# Altium footprint library iuh-thuc-hanh.PcbLib: 63 footprints (part 1 of 4)
Each footprint in its own frame and in the unit in brackets; x right, y up, seen from the top. Pads: shape width x height; smd on the part's side, far side on the other; paste and mask are expansions set on the pad; w line width, h text height; cw(c..) or ccw(c..) is an arc to the next point about the centre after c.
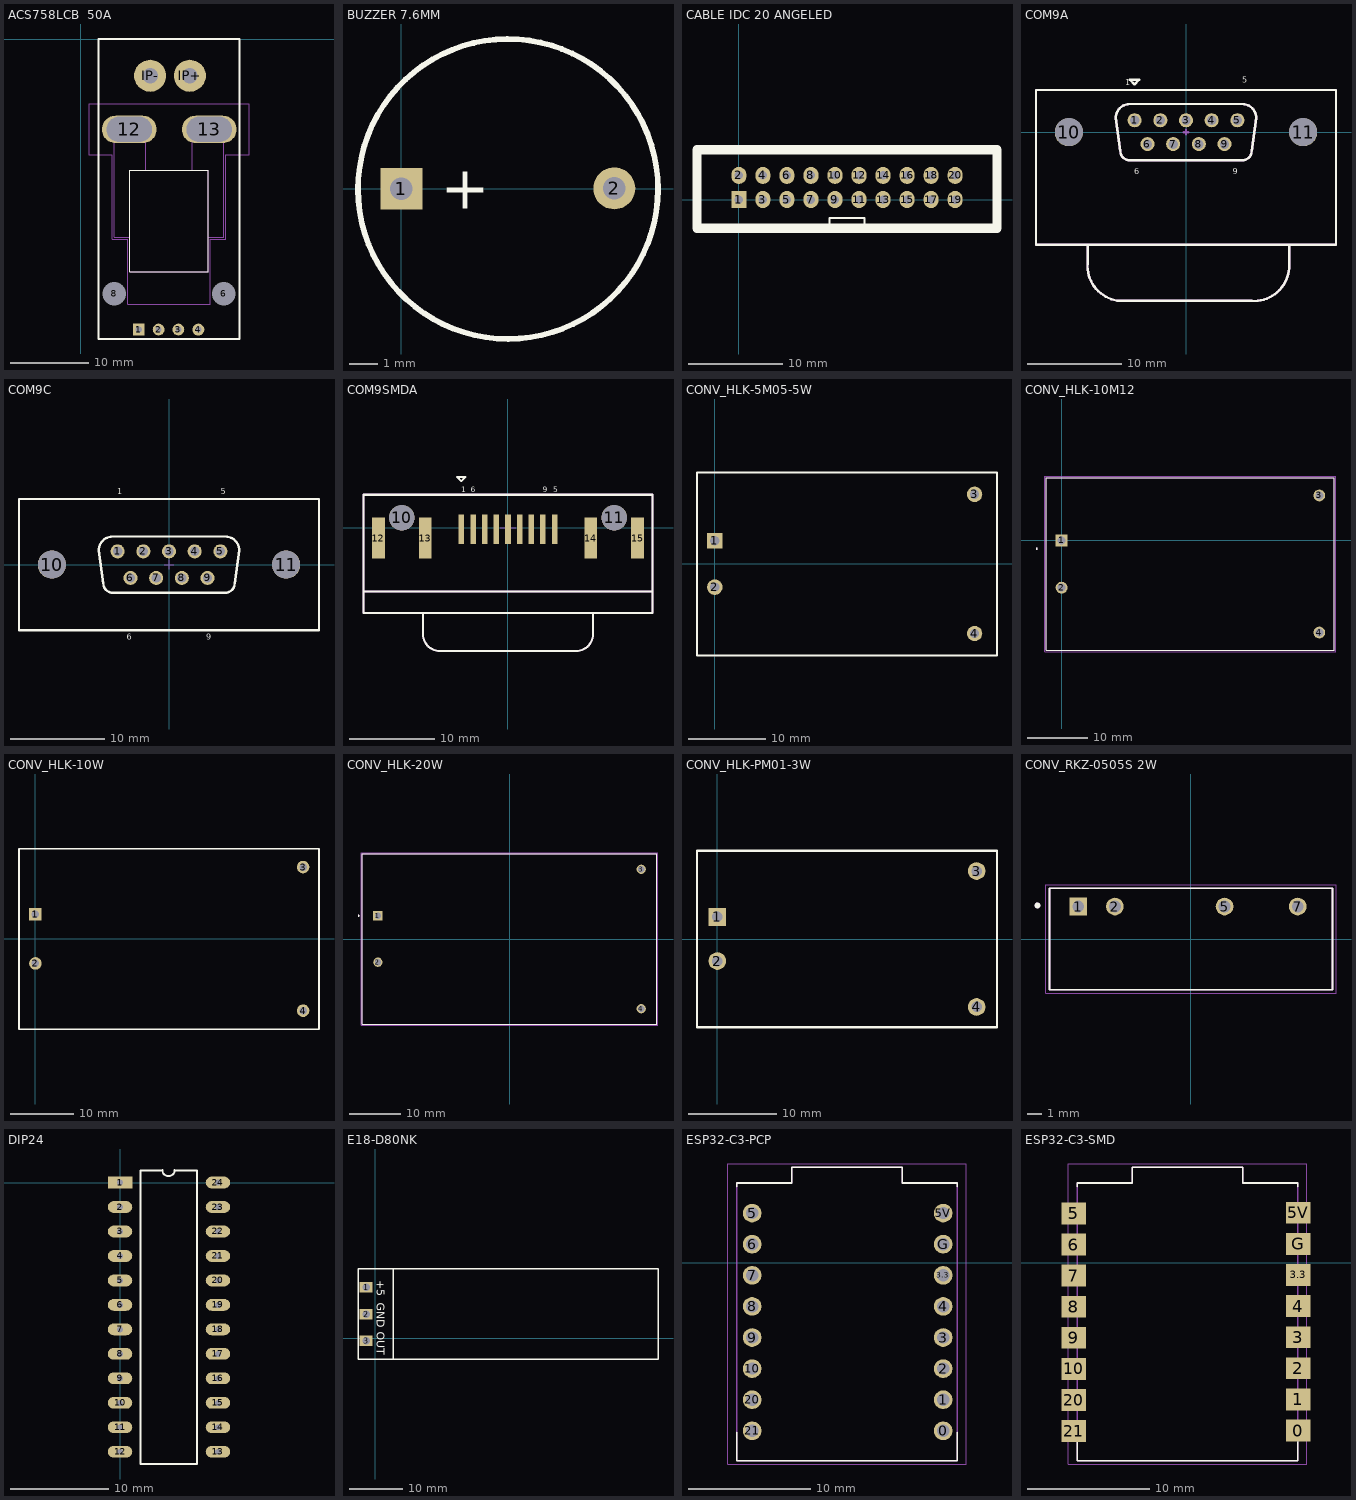
[diagram p0: the footprints below, top view; thin cyan lines are the x and y axes]

## ACS758LCB  50A [mm]
height 7.1
pads (10):
  rect 1.5x1.5 / inner round 1.5 / far side rect 1.5x1.5 hole 0.8: 1(7.434,-37.148)
  round 1.5 hole 0.8: 2(9.974,-37.148) 3(12.506,-37.148)
  round 1.524 hole 0.762: 4(15.054,-37.148)
  round 1.524 hole 3: 6(18.288,-32.575) 8(4.318,-32.575)
  oval 7x3.5 hole 3.2 slot 5.8 at 0 deg unplated: 12(6.223,-11.557) 13(16.447,-11.557)
  round 4.1 hole 2: IP+(13.97,-4.699) IP-(8.89,-4.699)
Top Overlay:
  circle w0.2: c10.219,-36.965 r0.1
  lines w0.127: 6.303,-29.775 16.303,-29.775 16.303,-16.775 6.303,-16.775 6.303,-29.775
  lines w0.254: 2.286,-38.354 2.286,0 20.32,0 20.32,-13.525 20.32,-38.354 2.286,-38.354
Mechanical 1:
  lines w0: 6.303,-10.525 6.353,-10.525 ; 16.303,-10.525 16.353,-10.525 ; 4.303,-12.525 cw(c4.303,-11.525) 4.303,-10.525 8.303,-10.525 cw(c8.303,-11.525) 8.303,-12.525 4.303,-12.525 ; 14.303,-12.525 cw(c14.303,-11.525) 14.303,-10.525 18.303,-10.525 cw(c18.303,-11.525) 18.303,-12.525 14.303,-12.525
Mechanical 13:
  circle w0.2: c10.219,-36.965 r0.1
  lines w0.127: 4.303,-10.775 4.303,-25.375 6.303,-25.375 ; 8.303,-16.725 8.303,-10.775 ; 14.303,-16.725 14.303,-10.775 18.303,-10.775 18.303,-25.375 16.303,-25.375 ; 6.303,-25.375 6.303,-16.775 16.303,-16.775 16.303,-29.775 6.303,-29.775 6.303,-25.375
Mechanical 15:
  lines w0.05: 1.053,-14.775 4.053,-14.775 4.053,-25.625 6.053,-25.625 6.053,-33.925 16.553,-33.925 16.553,-25.625 18.553,-25.625 18.553,-14.775 21.553,-14.775 21.553,-8.275 1.053,-8.275 ; 1.079,-14.755 1.079,-8.255
3D body "step_temp.STEP": height 7.1, standoff -3.5, extent 4.366,-33.361 18.367,-10.775
3D body: height -0.1, standoff -0.2, extent 2.27,-34.037 20.32,-8.234

## BUZZER 7.6MM [mm]
pads (2):
  rect 1.5x1.5 hole 0.8: 1(0,0)
  round 1.5 hole 0.8: 2(7.62,0.013)
Top Overlay:
  lines w0.203: 7.724,3.67 ccw(c3.816,-0.008) 7.76,3.632
  text "+" at 1.41,-0.711 h1.52
3D body "User Library-Buzzer WST-1203UX.step": height 4.5, standoff -9.65, extent -2.215,-6 13.239,6

## CABLE IDC 20 ANGELED [mm] "Connector; Header; 5x2 Position"
pads (20):
  rect 1.6x1.8 hole 0.9: 1(0,0)
  oval 1.6x1.8 hole 0.9: 2(0,2.54) 3(2.54,0) 4(2.54,2.54) 5(5.08,0) 6(5.08,2.54) 7(7.62,0) 8(7.62,2.54) 9(10.16,0) 10(10.16,2.54) 11(12.7,0) 12(12.7,2.54) 13(15.24,0) 14(15.24,2.54) 15(17.78,0) 16(17.78,2.54) 17(20.32,0) 18(20.32,2.54) 19(22.86,0) 20(22.86,2.54)
Top Overlay:
  lines w0.254: 9.576,-2.5 9.576,-1.956 11.43,-1.956 13.284,-1.956 13.284,-2.5
  lines w1: 8.28,-3.048 27.28,-3.048 27.28,5.27 8.28,5.27 ; 14.58,-3.048 -4.42,-3.048 -4.42,5.27 14.58,5.27
3D body "IDC 20P ANGELED MALE.stp": height 10.61, standoff -2.39, extent -5.08,-0.292 27.94,20.853

## COM9A [mm] "D-SUB- 9P, MALE, RT ANGLE, TH"
height 12
pads (11):
  round 1.5 hole 1 unplated: 1(-5.48,1.27) 2(-2.74,1.27) 3(0,1.27) 4(2.74,1.27) 5(5.48,1.27) 6(-4.11,-1.27) 7(-1.37,-1.27) 8(1.37,-1.27) 9(4.11,-1.27)
  round 3 hole 3 unplated: 10(-12.5,0) 11(12.5,0)
Top Overlay:
  lines w0.254: -10.5,-12 -10.5,-14 ccw(c-6.75,-14.25) -7,-18 7,-18 ccw(c7.25,-14.25) 11,-14.5 11,-12 ; -5.996,-3.004 cw(c-5.996,-2) -7,-2 -7.5,1.5 cw(c-6,1.5) -6,3 6,3 cw(c6,1.5) 7.5,1.5 7,-2 cw(c5.996,-2) 5.996,-3.004 ; -5.996,-3 6,-3 ; -5.5,5.1 -5,5.6 -6,5.6 -5.5,5.1 ; -5.5,5.1 -5.5,5.1 ; -16,-12 16,-12 16,4.5 -16,4.5 -16,0 -16,-12
  text "1" at -6.5,5 h0.64
  text "5" at 6,5.25 h0.64
  text "9" at 5,-4.5 h0.64
  text "6" at -5.5,-4.5 h0.64
Mechanical 15:
  lines w0.254: -10.5,-12 -10.5,-14 ccw(c-6.75,-14.25) -7,-18 7,-18 ccw(c7.25,-14.25) 11,-14.5 11,-12 ; -5.996,-3.004 cw(c-5.996,-2) -7,-2 -7.5,1.5 cw(c-6,1.5) -6,3 6,3 cw(c6,1.5) 7.5,1.5 7,-2 cw(c5.996,-2) 5.996,-3.004 ; -5.996,-3 6,-3 ; -0.25,0 0.25,0 ; 0,-0.25 0,0.25 ; -16,-12 -16,0 -16,4.5 16,4.5 16,-12 -16,-12
3D body "210112043.stp": height 13.2, standoff -3.6, extent -15.4,-17.5 15.4,4.2

## COM9C [mm] "D-SUB- 9P, MALE, SOLDER BUCKET VERTICAL MOUNT, TH"
height 12
pads (11):
  round 1.5 hole 1 unplated: 1(-5.48,1.42) 2(-2.74,1.42) 3(0,1.42) 4(2.74,1.42) 5(5.48,1.42) 6(-4.11,-1.42) 7(-1.37,-1.42) 8(1.37,-1.42) 9(4.11,-1.42)
  round 3 hole 3 unplated: 10(-12.5,0) 11(12.5,0)
Top Overlay:
  lines w0.254: -5.996,-3.004 cw(c-5.996,-2) -7,-2 -7.5,1.5 cw(c-6,1.5) -6,3 6,3 cw(c6,1.5) 7.5,1.5 7,-2 cw(c5.996,-2) 5.996,-3.004 ; -5.996,-3 6,-3 ; -16,-7 -16,0 -16,7 16,7 16,-7 -16,-7
  text "6" at -4.5,-8 h0.64
  text "9" at 4,-8 h0.64
  text "1" at -5.5,7.5 h0.64
  text "5" at 5.5,7.5 h0.64
Mechanical 15:
  lines w0.102: -0.5,0 0.5,0 ; 0,-0.5 0,0.5
3D body "210113003.stp": height 12.5, standoff -4.8, extent -15.4,-6.2 15.4,6.2

## COM9SMDA [mm] "D-SUB- 9P, MALE, RT ANGLE, SMT"
height 12.4
pads (15):
  rect 0.65x3.5 smd: 1(-5.48,-0.15) 2(-2.74,-0.15) 3(0,-0.15) 4(2.74,-0.15) 5(5.48,-0.15) 6(-4.11,-0.15) 7(-1.37,-0.15) 8(1.37,-0.15) 9(4.11,-0.15)
  round 3 hole 3 unplated: 10(-12.5,1.2) 11(12.5,1.2)
  rect 1.5x4.8 smd: 12(-15.25,-1.2) 13(-9.75,-1.2) 14(9.75,-1.2) 15(15.25,-1.2)
Top Overlay:
  lines w0.254: -10,-10 -10,-12.5 ccw(c-8,-12.5) -8,-14.5 8,-14.5 ccw(c8,-12.5) 10,-12.5 10,-10 ; -17,-7.5 -17,-10 17,-10 17,-7.5 ; -17,-7.5 -17,3.9 17,3.9 17,-7.5 ; -17,-7.5 17,-7.5 ; -6,6 -5.5,6 -5,6 -5.5,5.5 -6,6
  text "1" at -5.5,4.2 h0.64
  text "5" at 5.3,4.2 h0.64
  text "9" at 4.1,4.2 h0.64
  text "6" at -4.4,4.2 h0.64
Mechanical 15:
  lines w0.102: -0.9,0 0.9,0 ; 0,-0.9 0,0.9
  lines w0.254: -10,-10 -10,-12.5 ccw(c-8,-12.5) -8,-14.5 8,-14.5 ccw(c8,-12.5) 10,-12.5 10,-10 ; -17,-7.5 -17,-10 17,-10 17,-7.5 ; -17,-7.5 -17,3.9 17,3.9 17,-7.5 ; -17,-7.5 17,-7.5
3D body "240117113.stp": height 12.7, standoff -2.8, extent -15.5,-14.3 15.5,4

## CONV_HLK-5M05-5W [mm]
pads (4):
  rect 2x2 hole 1.2: 1(0,3)
  round 2 hole 1.2: 2(0,-3) 3(33.6,9) 4(33.6,-9)
Top Overlay:
  lines w0.254: -2.3,-11.822 36.5,-11.822 ; -2.3,-11.8 -2.3,11.8 36.5,11.8 36.5,-11.8
3D body "AC DC Converter HLK-5M05.step": height 18.65, standoff -4.65, extent -2.159,-11.65 36.441,11.65

## CONV_HLK-10M12 [mm]
pads (4):
  rect 1.95x1.95 / inner round 1.95 / far side rect 1.95x1.95 hole 1.3: 1(0,0)
  round 1.95 hole 1.3: 2(0,-7.8) 3(42.5,7.4) 4(42.5,-15.2)
Top Overlay:
  circle w0.2: c-4.12,-1.4 r0.1
  lines w0.127: -2.5,-18.15 45,-18.15 45,10.35 -2.5,10.35 -2.5,-18.15
Mechanical 13:
  circle w0.2: c-4.12,-1.4 r0.1
  lines w0.127: -2.5,-18.15 45,-18.15 45,10.35 -2.5,10.35 -2.5,-18.15
Mechanical 15:
  lines w0.05: -2.75,-18.4 -2.75,10.6 45.25,10.6 45.25,-18.4 -2.75,-18.4
3D body "step_temp.STEP": height 22, standoff -5, extent -2.5,-18.15 45,10.35

## CONV_HLK-10W [mm]
pads (4):
  rect 2x2 hole 1.2: 1(0,3.9)
  round 2 hole 1.2: 2(0,-3.9) 3(42.5,11.4) 4(42.5,-11.4)
Top Overlay:
  lines w0.254: -2.6,-14.339 45,-14.339 ; -2.6,-14.3 -2.6,14.3 45,14.3 ; 45.025,-14.3 45.025,14.3
3D body "HLK-10M05 3D Model STEP 510211.STEP": height 22.5, standoff -4.5, extent -2.541,-14.25 44.959,14.25

## CONV_HLK-20W [mm]
pads (4):
  rect 1.8x1.8 hole 1.2: 1(-25.5,4.5)
  round 1.8 hole 1.2: 2(-25.5,-4.5) 3(25.5,13.5) 4(25.5,-13.5)
Top Overlay:
  circle w0.2: c-29.25,4.5 r0.1
  lines w0.127: -28.5,-16.5 -28.5,16.5 28.5,16.5 28.5,-16.5 -28.5,-16.5
Mechanical 13:
  circle w0.2: c-29.25,4.5 r0.1
  lines w0.127: -28.5,-16.5 -28.5,16.5 28.5,16.5 28.5,-16.5 -28.5,-16.5
Mechanical 15:
  lines w0.05: -28.75,-16.75 -28.75,16.75 28.75,16.75 28.75,-16.75 -28.75,-16.75
3D body "HLK-20M12--3DModel-STEP-56544.STEP": height 22.51, standoff -5, extent -28.425,-16.373 28.575,16.627

## CONV_HLK-PM01-3W [mm]
pads (4):
  rect 2x2 hole 1.2: 1(0,2.5)
  round 2 hole 1.2: 2(0,-2.5) 3(29.4,7.7) 4(29.4,-7.7)
Top Overlay:
  lines w0.254: -2.3,-10 31.7,-10 31.7,10 -2.3,10 -2.3,-10
3D body "User Library HLK-PM01.SLDPRT": height 15.3, standoff -4.8, extent -2.286,-10.1 31.714,10.1

## CONV_RKZ-0505S 2W [mm]
pads (4):
  rect 1.23x1.23 hole 0.82: 1(-7.825,2.255)
  round 1.23 hole 0.82: 2(-5.285,2.255) 5(2.335,2.255) 7(7.415,2.255)
Top Overlay:
  circle w0.2: c-10.665,2.33 r0.1
  lines w0.127: -9.825,-3.525 9.825,-3.525 9.825,3.525 -9.825,3.525 -9.825,-3.525
Mechanical 13:
  circle w0.2: c-10.665,2.33 r0.1
  lines w0.127: -9.825,-3.525 9.825,-3.525 9.825,3.525 -9.825,3.525 -9.825,-3.525
Mechanical 15:
  lines w0.05: -10.075,-3.775 10.075,-3.775 10.075,3.775 -10.075,3.775 -10.075,-3.775

## DIP24 [mm]
pads (24):
  rect 2.5x1.2 hole 0.6: 1(0,0)
  oval 2.5x1.2 hole 0.6: 2(0,-2.5) 3(0,-5) 4(0,-7.5) 5(0,-10) 6(0,-12.5) 7(0,-15) 8(0,-17.5) 9(0,-20) 10(0,-22.5) 11(0,-25) 12(0,-27.5) 13(10,-27.5) 14(10,-25) 15(10,-22.5) 16(10,-20) 17(10,-17.5) 18(10,-15) 19(10,-12.5) 20(10,-10) 21(10,-7.5) 22(10,-5) 23(10,-2.5) 24(10,0)
Top Overlay:
  lines w0.2: 4.328,1.25 2.085,1.25 2.085,-28.75 7.874,-28.75 7.874,1.25 5.588,1.25 ; 4.328,1.27 ccw(c4.953,1.27) 5.578,1.27

## E18-D80NK [mm] "Cam bien khoang cach hong ngoai"
pads (3):
  rect 2.5x2 hole 1.4: 1(-1.778,9.652) 2(-1.778,4.572) 3(-1.778,-0.508)
Top Overlay:
  lines w0.254: 3.34,-3.919 3.34,13.081 ; -3.302,-3.919 -3.302,13.081 53.34,13.081 53.34,-3.919 -3.302,-3.919
  text "OUT" at 0.254,1.27 h1.52
  text "+5" at 0.254,10.922 h1.52
  text "GND" at 0.254,6.667 h1.52
3D body "Proximity Sensor E18-D.step": height 21.65, standoff -1.65, extent -3.127,-6.951 53.173,16.349

## ESP32-C3-PCP [mil]
pads (16):
  round 60 hole 39.37: 0(2964.17,-540) 1(2964.17,-440) 2(2964.17,-340) 3(2964.17,-240) 3.3(2964.17,-40) 4(2964.17,-140) 5(2350,160) 5V(2964.17,160) 6(2350,60) 7(2350,-40) 8(2350,-140) 9(2350,-240) 10(2350,-340) 20(2350,-440) 21(2350,-540) G(2964.17,60)
Top Overlay:
  lines w5: 2300.67,-544.33 2300.67,-636.85 3009.33,-636.85 3009.33,-544.33 ; 2300.67,245.04 2300.67,256.85 2477.83,256.85 2477.83,308.03 2832.17,308.03 2832.17,256.85 3009.33,256.85 3009.33,245.04
Mechanical 13:
  lines w5: 2300.67,-636.85 2300.67,256.85 2477.83,256.85 2477.83,308.03 2832.17,308.03 2832.17,256.85 3009.33,256.85 3009.33,-636.85 2300.67,-636.85
Mechanical 15:
  lines w1.97: 2271.24,-646.69 2271.24,317.87 3038.76,317.87 3038.76,-646.69 2271.24,-646.69
3D body "ESP32-C3 SuperMini--3DModel-STEP-56544.STEP": height 163.79, standoff 0, extent 2295.67,-671.85 3004.33,273.03

## ESP32-C3-SMD [mil]
pads (16):
  rect 80x70 smd: 0(3011,-539) 1(3011,-439) 2(3011,-339) 3(3011,-239) 3.3(3011,-39) 4(3011,-139) 5(2289,159) 5V(3011,161) 6(2289,59) 7(2289,-41) 8(2289,-141) 9(2289,-241) 10(2289,-341) 20(2289,-441) 21(2289,-541) G(3011,61)
Top Overlay:
  lines w5: 2300.67,-544.33 2300.67,-636.85 3009.33,-636.85 3009.33,-544.33 ; 2300.67,245.04 2300.67,256.85 2477.83,256.85 2477.83,308.03 2832.17,308.03 2832.17,256.85 3009.33,256.85 3009.33,245.04
Mechanical 13:
  lines w5: 2300.67,-636.85 2300.67,256.85 2477.83,256.85 2477.83,308.03 2832.17,308.03 2832.17,256.85 3009.33,256.85 3009.33,-636.85 2300.67,-636.85
Mechanical 15:
  lines w1.97: 2271.24,-646.69 2271.24,317.87 3038.76,317.87 3038.76,-646.69 2271.24,-646.69
3D body "ESP32-C3 SuperMini--3DModel-STEP-56544.STEP": height 163.79, standoff 0, extent 2295.67,-674.88 3004.33,270